# Altium footprint library Eis_Lib.PcbLib: 75 footprints (part 1 of 5)
Each footprint in its own frame and in the unit in brackets; x right, y up, seen from the top. Pads: shape width x height; smd on the part's side, far side on the other; paste and mask are expansions set on the pad; w line width, h text height; cw(c..) or ccw(c..) is an arc to the next point about the centre after c.
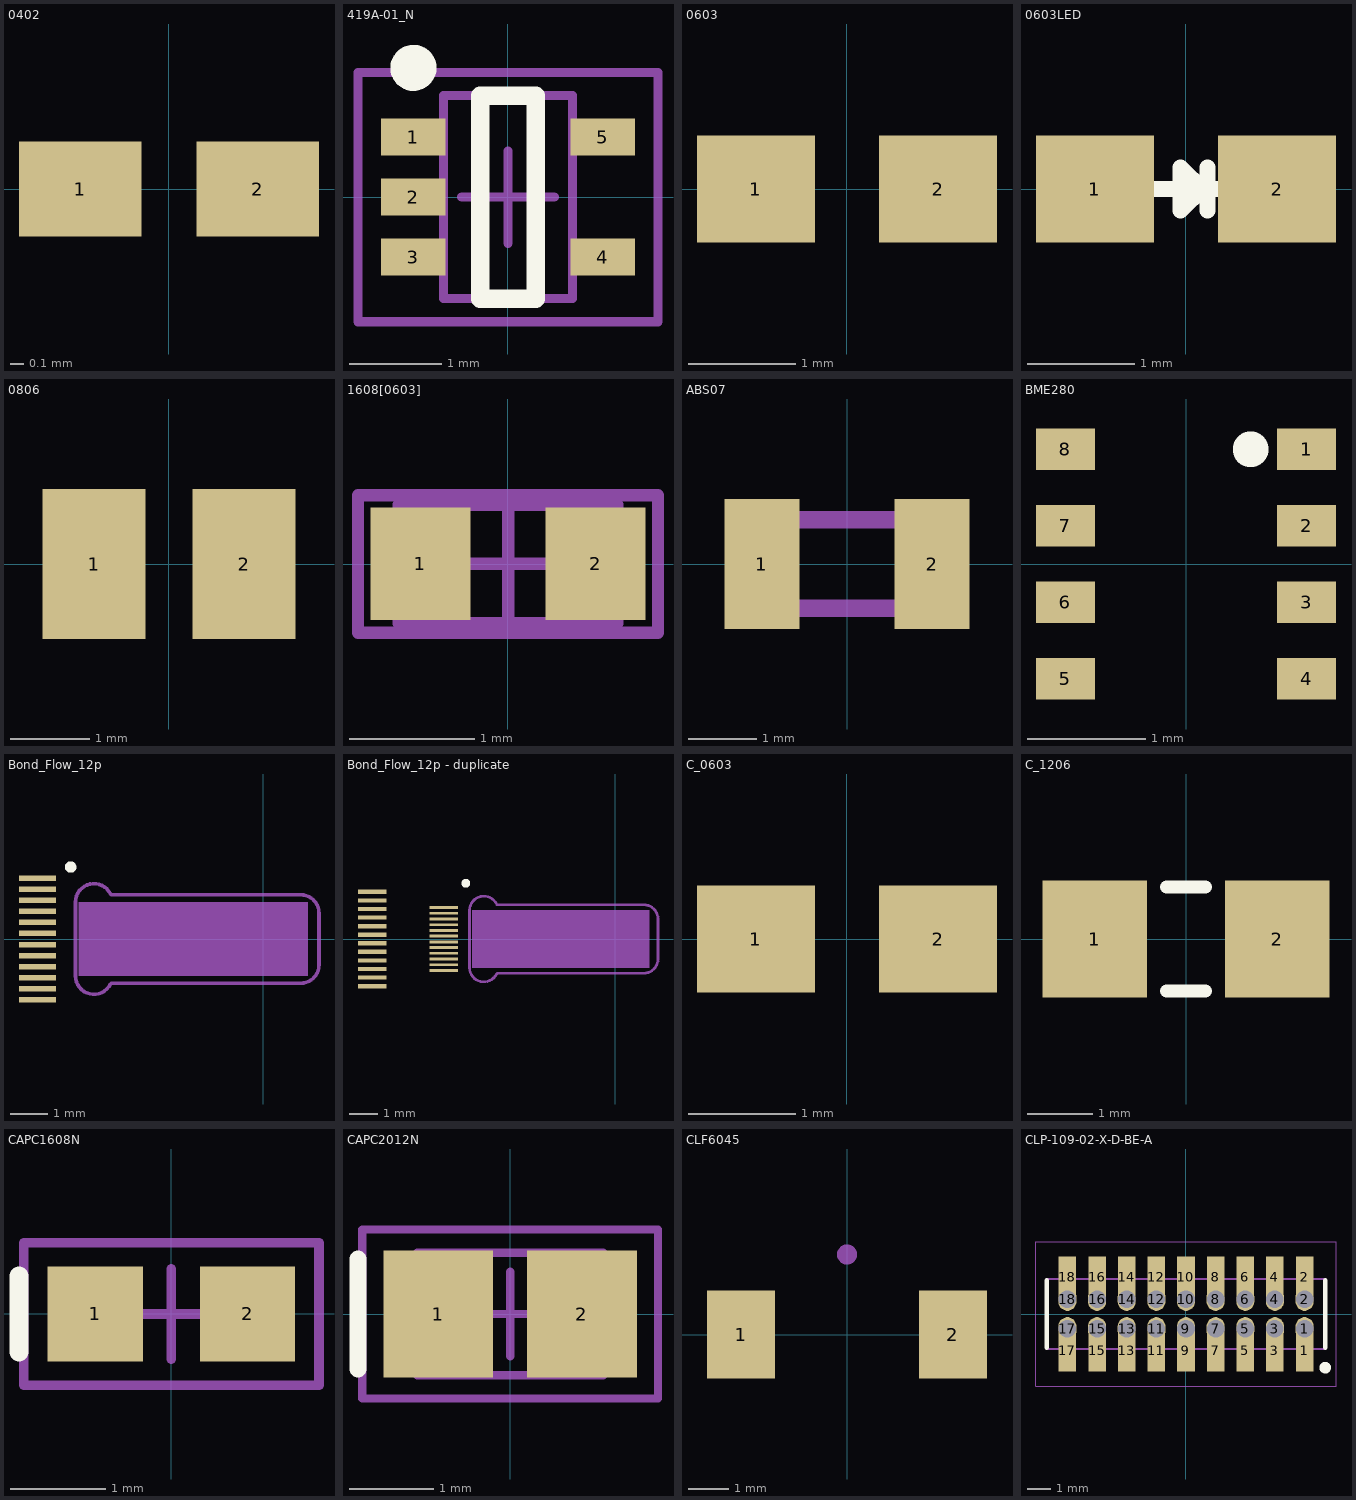
[diagram p0: the footprints below, top view; thin cyan lines are the x and y axes]

## 0402 [mm] "Chip Resistor; Body 1 x 0.5 mm (LxW typ)"
height 0.4
pads (2):
  rect 0.9x0.7 smd: 1(-0.65,0) 2(0.65,0)
3D body: height 0.35, standoff 0, extent -0.5,-0.25 0.5,0.25

## 419A-01_N [mm] "SOT353, 5-Leads, Body 2x1.3mm, Pitch 0.65mm, Lead Span 2.1mm, IPC Medium Density"
height 1.1
pads (5):
  rect 0.7x0.4 smd: 1(-1.025,0.65) 2(-1.025,0) 3(-1.025,-0.65) 4(1.025,-0.65) 5(1.025,0.65)
Top Overlay:
  circle w0.25: c-1.025,1.4 r0.125
  lines w0.2: -0.3,-1.1 -0.3,1.1 0.3,1.1 0.3,-1.1 -0.3,-1.1
Mechanical 13:
  lines w0.1: -0.7,-1.1 0.7,-1.1 0.7,1.1 -0.7,1.1 -0.7,-1.1
Mechanical 15:
  lines w0.1: -0.5,0 0.5,0 ; 0,-0.5 0,0.5 ; -1.625,-1.35 1.625,-1.35 1.625,1.35 -1.625,1.35 -1.625,-1.35
3D body: height 1.1, standoff 0, extent -0.7,-1.1 0.7,1.1

## 0603 [mm] "Chip Resistor; Body 1.6 x 0.9 mm (LxW typ)"
height 0.55
pads (2):
  rect 1.1x1 smd: 1(-0.85,0) 2(0.85,0)
3D body: height 0.45, standoff 0, extent -0.8,-0.4 0.8,0.4

## 0603LED [mm] "Chip LED Body 1.6 x 0.9 mm (LxW typ)"
height 0.55
pads (2):
  rect 1.1x1 smd: 1(-0.85,0) 2(0.85,0)
Top Overlay:
  lines w0.15: -0.35,0 0.5,0 ; 0.2,-0.2 0.2,0.2 ; -0.05,-0.2 0.15,0 -0.05,0.2 -0.05,-0.2
3D body: height 0.73, standoff 0.05, extent -0.825,-0.355 0.825,0.37

## 0806 [mm] "Chip Inductance; Body 2 x 1.6 mm (LxW typ)"
height 1.6
pads (2):
  rect 1.3x1.9 smd: 1(-0.95,0) 2(0.95,0)
3D body: height 0.6, standoff 0, extent -1,-0.625 1,0.625

## 1608[0603] [mm] "Chip Capacitor, Body 1.6x0.8mm, IPC High Density"
height 1.3
pads (2):
  rect 0.8x0.9 smd: 1(-0.7,0) 2(0.7,0)
Mechanical 13:
  lines w0.1: -0.875,-0.475 0.875,-0.475 0.875,0.475 -0.875,0.475 -0.875,-0.475
Mechanical 15:
  lines w0.1: -0.475,0 0.475,0 ; 0,-0.475 0,0.475 ; -1.2,-0.55 1.2,-0.55 1.2,0.55 -1.2,0.55 -1.2,-0.55
3D body: height 1.3, standoff 0, extent -0.875,-0.475 0.875,0.475

## ABS07 [mm] "quartz crystal, Typ: ABS07 bzw. CM315, 3.2x1.5x0.9mm"
height 0.9
pads (2):
  rect 1.1x1.9 smd: 1(-1.25,0) 2(1.25,0)
Mechanical 13:
  lines w0.254: 1.575,-0.625 1.6,-0.65 ; 1.575,0.65 -1.6,0.65 -1.6,-0.65 -1.225,-0.65 1.6,-0.65 ; 1.6,0.65 1.6,-0.65
3D body: height 0.9, standoff 0, extent -1.727,-0.777 1.727,0.777

## BME280 [mm] "8 pin Druck/Feuchte/Temp"
height 0.93
pads (8):
  rect 0.5x0.35 smd: 1(1.025,0.975) 2(1.025,0.325) 3(1.025,-0.325) 4(1.025,-0.975) 5(-1.025,-0.975) 6(-1.025,-0.325) 7(-1.025,0.325) 8(-1.025,0.975)
Top Overlay:
  circle w0.254: c0.55,0.975 r0.025
3D body: height 0.93, standoff 0, extent -1.25,-1.25 1.25,1.25
3D body: height 0.94, standoff 0, extent -0.298,0.326 0.3,0.925

## Bond_Flow_12p [mm] "Chip in PCB-Tasche buendig einkleben (600µm tiefe Fräsung)"
height 0.6
pads (12):
  rect 1x0.15 smd paste-1: 1(-6.125,1.65) 2(-6.125,1.35) 3(-6.125,1.05) 4(-6.125,0.75) 5(-6.125,0.45) 6(-6.125,0.15) 7(-6.125,-0.15) 8(-6.125,-0.45) 9(-6.125,-0.75) 10(-6.125,-1.05) 11(-6.125,-1.35) 12(-6.125,-1.65)
Top Overlay:
  circle w0.15: c-5.225,1.95 r0.079
Fräß-Spur:
  lines w0.1: -4.149,-1.227 cw(c-4.595,-1) -5.095,-1 -5.095,1 cw(c-4.595,1) -4.142,1.211 ; -4.12,-1.2 1.005,-1.2 ccw(c1.005,-0.7) 1.505,-0.7 1.505,0.7 ccw(c1.005,0.7) 1.005,1.2 -4.12,1.2
Mechanical 13:
  lines w0.1: -4.149,-1.227 cw(c-4.595,-1) -5.095,-1 -5.095,1 cw(c-4.595,1) -4.142,1.211 ; -4.12,-1.2 1.005,-1.2 ccw(c1.005,-0.7) 1.505,-0.7 1.505,0.7 ccw(c1.005,0.7) 1.005,1.2 -4.12,1.2
Mechanical 15:
  circle w0.1: c0,0 r0.5
  cavity: -5,1 1.2,1 1.2,-1 -5,-1
3D body: height 0.01, standoff -0.5, extent -4.9,-1 1.1,1

## Bond_Flow_12p - duplicate [mm] "Chip in PCB-Tasche buendig einkleben"
pads (24):
  rect 1x0.15 smd paste-1: 1(-8.5,1.65) 2(-8.5,1.35) 3(-8.5,1.05) 4(-8.5,0.75) 5(-8.5,0.45) 6(-8.5,0.15) 7(-8.5,-0.15) 8(-8.5,-0.45) 9(-8.5,-0.75) 10(-8.5,-1.05) 11(-8.5,-1.35) 12(-8.5,-1.65)
  rect 1x0.1 smd paste-1: 1(-6,1.1) 2(-6,0.9) 3(-6,0.7) 4(-6,0.5) 5(-6,0.3) 6(-6,0.1) 7(-6,-0.1) 8(-6,-0.3) 9(-6,-0.5) 10(-6,-0.7) 11(-6,-0.9) 12(-6,-1.1)
Top Overlay:
  circle w0.15: c-5.225,1.95 r0.079
Fräß-Spur:
  lines w0.1: -4.149,-1.227 cw(c-4.595,-1) -5.095,-1 -5.095,1 cw(c-4.595,1) -4.142,1.211 ; -4.12,-1.2 1.005,-1.2 ccw(c1.005,-0.7) 1.505,-0.7 1.505,0.7 ccw(c1.005,0.7) 1.005,1.2 -4.12,1.2
Mechanical 13:
  lines w0.1: -4.149,-1.227 cw(c-4.595,-1) -5.095,-1 -5.095,1 cw(c-4.595,1) -4.142,1.211 ; -4.12,-1.2 1.005,-1.2 ccw(c1.005,-0.7) 1.505,-0.7 1.505,0.7 ccw(c1.005,0.7) 1.005,1.2 -4.12,1.2
Mechanical 15:
  circle w0.1: c0,0 r0.5
  cavity: -5,1 1.2,1 1.2,-1 -5,-1
3D body: height 0.01, standoff -0.5, extent -4.9,-1 1.1,1

## C_0603 [mm] "Chip Resistor; Body 1.6 x 0.9 mm (LxW typ)"
height 0.55
pads (2):
  rect 1.1x1 smd: 1(-0.85,0) 2(0.85,0)
3D body: height 0.8, standoff 0, extent -0.8,-0.4 0.8,0.4

## C_1206 [mm] "Chip Resistor; Body 3.1 x 1.6 mm (LxW typ)"
pads (2):
  rect 1.6x1.8 smd: 1(-1.4,0) 2(1.4,0)
Top Overlay:
  lines w0.2: -0.3,-0.8 0.3,-0.8 ; -0.3,0.8 0.3,0.8
3D body: height 0.77, standoff -0.01, extent -1.6,-0.8 1.6,0.8

## CAPC1608N [mm]
pads (2):
  rect 1x1 smd: 1(-0.8,0) 2(0.8,0)
Top Overlay:
  lines w0.2: -1.6,-0.4 -1.6,0.4
Mechanical 15:
  lines w0.1: -0.475,0 0.475,0 ; 0,-0.475 0,0.475 ; -1.55,-0.75 1.55,-0.75 1.55,0.75 -1.55,0.75 -1.55,-0.75
3D body: height 0.8, standoff 0, extent -0.8,-0.425 0.8,0.375

## CAPC2012N [mm] "Chip Capacitor, Body 2.0x1.3mm, IPC Medium Density"
height 1.1
pads (2):
  rect 1.3x1.5 smd: 1(-0.85,0) 2(0.85,0)
Top Overlay:
  lines w0.2: -1.8,-0.65 -1.8,0.65
Mechanical 13:
  lines w0.1: -1.1,-0.725 1.1,-0.725 1.1,0.725 -1.1,0.725 -1.1,-0.725
Mechanical 15:
  lines w0.1: -0.5,0 0.5,0 ; 0,-0.5 0,0.5 ; -1.75,-1 1.75,-1 1.75,1 -1.75,1 -1.75,-1
3D body: height 1.1, standoff 0, extent -1.1,-0.725 1.1,0.725

## CLF6045 [mm] "TDK-Spule, 5.9x6.2x4.5mm geschirmt"
height 4.5
pads (2):
  rect 1.7x2.2 smd: 1(-2.65,0) 2(2.65,0)
Mechanical 1:
  circle w0.254: c0,2 r0.125
3D body: height 4.5, standoff 0, extent -2.976,-2.994 3,2.994

## CLP-109-02-X-D-BE-A [mm] "1.27mm pitch, 18 pin, socket strip; low profile, vertical"
height 2.26
pads (36):
  rect 0.75x1.8 smd paste-1 mask+0: 1(5.08,-1.57) 2(5.08,1.57) 3(3.81,-1.57) 4(3.81,1.57) 5(2.54,-1.57) 6(2.54,1.57) 7(1.27,-1.57) 8(1.27,1.57) 9(0,-1.57) 10(0,1.57) 11(-1.27,-1.57) 12(-1.27,1.57) 13(-2.54,-1.57) 14(-2.54,1.57) 15(-3.81,-1.57) 16(-3.81,1.57) 17(-5.08,-1.57) 18(-5.08,1.57)
  oval 0.77x1 / inner round 0.5 / far side oval 0.77x1 hole 0.75 unplated paste-1 mask+0: 1(5.08,-0.635) 2(5.08,0.635) 3(3.81,-0.635) 4(3.81,0.635) 5(2.54,-0.635) 6(2.54,0.635) 7(1.27,-0.635) 8(1.27,0.635) 9(0,-0.635) 10(0,0.635) 11(-1.27,-0.635) 12(-1.27,0.635) 13(-2.54,-0.635) 14(-2.54,0.635) 15(-3.81,-0.635) 16(-3.81,0.635) 17(-5.08,-0.635) 18(-5.08,0.635)
Top Overlay:
  circle w0.25: c5.965,-2.3 r0.125
  lines w0.2: -5.965,-1.45 -5.965,1.45 ; 5.965,-1.45 5.965,1.45
Mechanical 12:
  lines w0.001: -5.965,-1.5 -5.965,1.5 5.965,1.5 5.965,-1.5 -5.965,-1.5
Mechanical 13:
  lines w0.1: -5.969,-1.5 -5.969,1.5 5.965,1.5 5.965,-1.5 -5.969,-1.5
Mechanical 15:
  lines w0.05: -6.426,-3.099 -6.426,3.099 6.426,3.099 6.426,-3.099 -6.426,-3.099
3D body: height 2.27, standoff -0.49, extent -5.931,-2.159 5.931,2.159